# Altium footprint library Conectors.PcbLib: 122 footprints (part 7 of 8)
Each footprint in its own frame and in the unit in brackets; x right, y up, seen from the top. Pads: shape width x height; smd on the part's side, far side on the other; paste and mask are expansions set on the pad; w line width, h text height; cw(c..) or ccw(c..) is an arc to the next point about the centre after c.
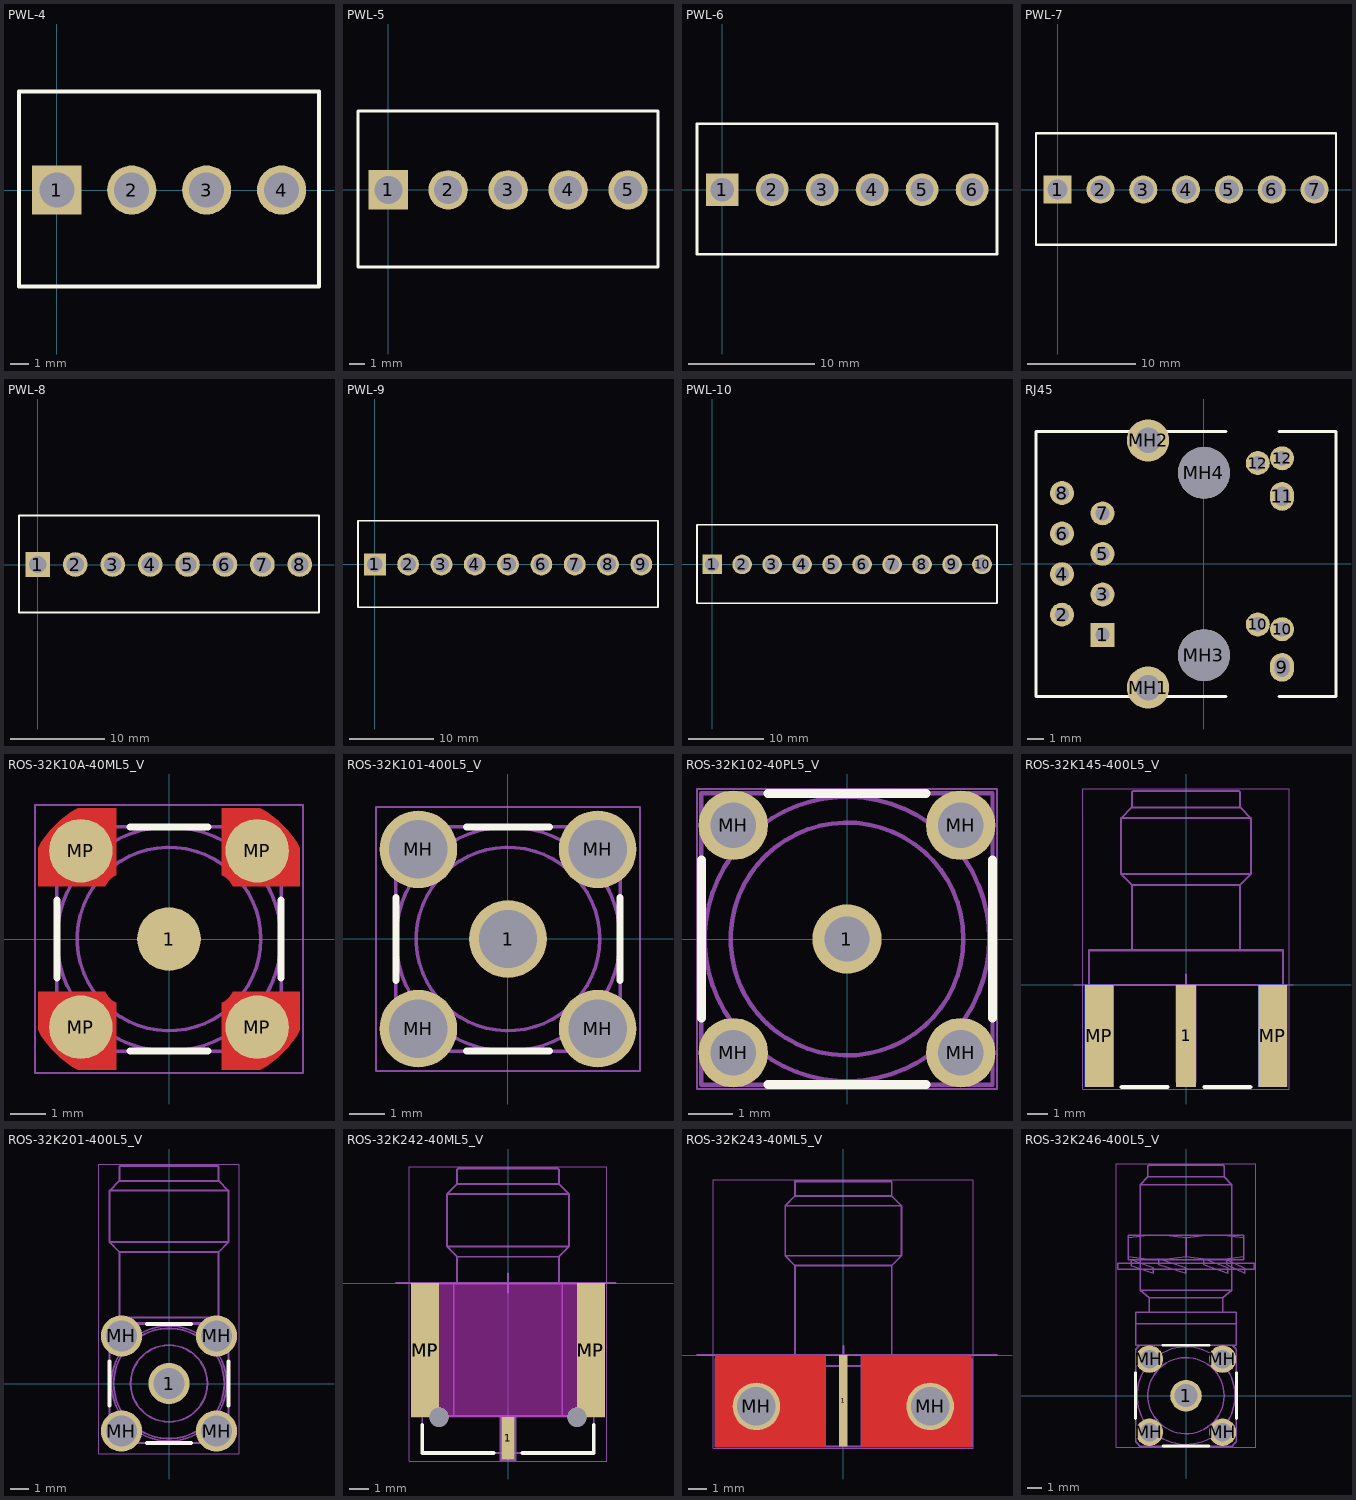
[diagram p6: the footprints below, top view; thin cyan lines are the x and y axes]

## PWL-4 [mm] "Connector; Header; 4 Position"
height 0.001
pads (4):
  rect 2.6x2.6 hole 1.85: 1(0,0)
  round 2.6 hole 1.85: 2(3.96,0) 3(7.92,0) 4(11.88,0)
Top Overlay:
  lines w0.2: -2,-5.1 -2,5.207 13.86,5.207 13.86,-5.1 -2,-5.1
3D body "PWL-4.stp": height 13.5, standoff -4, extent -1.98,-5 13.86,5

## PWL-5 [mm] "Connector; Header; 5 Position"
height 0.001
pads (5):
  rect 2.6x2.6 hole 1.85: 1(0,0)
  round 2.6 hole 1.85: 2(3.96,0) 3(7.92,0) 4(11.88,0) 5(15.84,0)
Top Overlay:
  lines w0.2: -2,-5.1 -2,5.207 17.82,5.207 17.82,-5.1 -2,-5.1
3D body "PWL-5.stp": height 13.5, standoff -4, extent -1.98,-5 17.82,5

## PWL-6 [mm] "Connector; Header; 6 Position"
height 0.001
pads (6):
  rect 2.6x2.6 hole 1.85: 1(0,0)
  round 2.6 hole 1.85: 2(3.96,0) 3(7.92,0) 4(11.88,0) 5(15.84,0) 6(19.8,0)
Top Overlay:
  lines w0.2: -2,-5.1 -2,5.207 21.78,5.207 21.78,-5.1 -2,-5.1
3D body "PWL-6.stp": height 13.5, standoff -4, extent -1.98,-5 21.78,5

## PWL-7 [mm] "Connector; Header; 7 Position"
height 0.001
pads (7):
  rect 2.6x2.6 hole 1.85: 1(0,0)
  round 2.6 hole 1.85: 2(3.96,0) 3(7.92,0) 4(11.88,0) 5(15.84,0) 6(19.8,0) 7(23.76,0)
Top Overlay:
  lines w0.2: -2,-5.1 25.74,-5.1 25.74,5.207 -2,5.207 -2,-5.1
3D body "PWL-7.stp": height 13.5, standoff -4, extent -1.98,-5 25.74,5

## PWL-8 [mm] "Connector; Header; 8 Position"
height 0.001
pads (8):
  rect 2.6x2.6 hole 1.85: 1(0,0)
  round 2.6 hole 1.85: 2(3.96,0) 3(7.92,0) 4(11.88,0) 5(15.84,0) 6(19.8,0) 7(23.76,0) 8(27.72,0)
Top Overlay:
  lines w0.2: -2,-5.1 -2,5.207 29.75,5.207 29.75,-5.1 -2,-5.1
3D body "PWL-8.stp": height 13.5, standoff -4, extent -1.962,-4.92 29.718,5.08

## PWL-9 [mm] "Connector; Header; 9 Position"
height 0.001
pads (9):
  rect 2.6x2.6 hole 1.85: 1(0,0)
  round 2.6 hole 1.85: 2(3.96,0) 3(7.92,0) 4(11.88,0) 5(15.84,0) 6(19.8,0) 7(23.76,0) 8(27.72,0) 9(31.68,0)
Top Overlay:
  lines w0.2: -2,-5.1 -2,5.207 33.66,5.207 33.66,-5.1 -2,-5.1
3D body "PWL-9.stp": height 13.5, standoff -4, extent -1.98,-5 33.66,5

## PWL-10 [mm] "Connector; Header; 10 Position"
height 0.001
pads (10):
  rect 2.6x2.6 hole 1.85: 1(0,0)
  round 2.6 hole 1.85: 2(3.96,0) 3(7.92,0) 4(11.88,0) 5(15.84,0) 6(19.8,0) 7(23.76,0) 8(27.72,0) 9(31.68,0) 10(35.64,0)
Top Overlay:
  lines w0.2: -2,-5.1 -2,5.207 37.62,5.207 37.62,-5.1 -2,-5.1
3D body "PWL-10.stp": height 13.5, standoff -4, extent -1.98,-5 37.62,5

## RJ45 [mm]
height 12
pads (18):
  rect 1.5x1.5 hole 0.9: 1(-6.35,-4.45)
  round 1.5 hole 0.9: 2(-8.89,-3.18) 3(-6.35,-1.91) 4(-8.89,-0.64) 5(-6.35,0.63) 6(-8.89,1.9) 7(-6.35,3.17) 8(-8.89,4.44) 10(3.38,-3.79) 10(4.9,-4.09) 12(3.38,6.32) 12(4.9,6.62)
  oval 1.5x1.8 hole 0.9 slot 1.2 at 90 deg: 9(4.9,-6.48) 11(4.9,4.23)
  round 2.65 hole 1.6: MH1(-3.5,-7.75) MH2(-3.5,7.74)
  round 3.25 hole 3.25 unplated: MH3(0,-5.72) MH4(0,5.71)
Top Overlay:
  lines w0.2: 1.378,-8.305 -10.52,-8.305 -10.52,8.295 1.378,8.295 ; 4.722,-8.305 8.28,-8.305 8.28,8.295 4.722,8.295
3D body "RJ-45-new.stp": height 12.71, standoff 0, extent -9.75,-7.51 7.75,7.51

## ROS-32K10A-40ML5_V [mm] "SMA Straight Jack, Press-Fit, 6.35x6.35x9.5mm, Rosenberger Recommended"
height 9.5
pads (5):
  round 1.8 smd: 1(0,0) MP(-2.5,-2.5) MP(-2.5,2.5) MP(2.5,-2.5) MP(2.5,2.5)
Top Layer:
  region: 1.5,1.8 1.549,1.777 1.64,1.716 1.716,1.639 1.777,1.549 1.8,1.5 3.7,1.5 3.7,2.587 3.608,2.765 3.371,3.088 3.088,3.371 2.765,3.608 2.587,3.7 1.5,3.7
  region: -1.8,1.5 -1.777,1.549 -1.716,1.64 -1.639,1.716 -1.549,1.777 -1.5,1.8 -1.5,3.7 -2.587,3.7 -2.765,3.608 -3.088,3.371 -3.371,3.088 -3.608,2.765 -3.7,2.587 -3.7,1.5
  region: -1.5,-1.8 -1.549,-1.777 -1.64,-1.716 -1.716,-1.639 -1.777,-1.549 -1.8,-1.5 -3.7,-1.5 -3.7,-2.587 -3.608,-2.765 -3.371,-3.088 -3.088,-3.371 -2.765,-3.608 -2.587,-3.7 -1.5,-3.7
  region: 1.8,-1.5 1.777,-1.549 1.716,-1.64 1.639,-1.716 1.549,-1.777 1.5,-1.8 1.5,-3.7 2.587,-3.7 2.765,-3.608 3.088,-3.371 3.371,-3.088 3.608,-2.765 3.7,-2.587 3.7,-1.5
Top Overlay:
  lines w0.2: -3.175,-1.1 -3.175,1.1 ; -1.1,-3.175 1.1,-3.175 ; -1.1,3.175 1.1,3.175 ; 3.175,-1.1 3.175,1.1
Mechanical 13:
  circle w0.1: c0,0 r0.635
  circle w0.1: c0,0 r2.6
  circle w0.1: c0,0 r3.175
  lines w0.1: -3.188,-2.811 ccw(c0,0) -2.811,-3.188 ; -3.188,2.811 cw(c0,0) -2.811,3.188 ; -3.175,-2.8 -3.175,2.8 ; -3.175,-1.9 -1.9,-1.9 -1.9,-3.175 ; -3.175,1.9 -1.9,1.9 -1.9,3.175 ; -2.8,-3.175 2.8,-3.175 ; -2.8,3.175 2.8,3.175 ; -0.1,-0.627 -0.1,0.627 ; 0.1,-0.627 0.1,0.627 ; 1.9,-3.175 1.9,-1.9 3.175,-1.9 ; 1.9,3.175 1.9,1.9 3.175,1.9 ; 2.811,-3.188 ccw(c0,0) 3.188,-2.811 ; 2.811,3.188 cw(c0,0) 3.188,2.811 ; 3.175,-2.8 3.175,2.8
Mechanical 15:
  lines w0.05: -3.8,-3.8 -3.8,3.8 3.8,3.8 3.8,-3.8 -3.8,-3.8
  lines w0.1: -0.5,0 0.5,0 ; 0,-0.5 0,0.5
3D body "32k10a-40ml5.stp": height 9.5, standoff 0, extent -3.175,-3.175 3.175,3.175

## ROS-32K101-400L5_V [mm] "SMA Straight Jack, 6.35x6.35x9.5mm, Rosenberger Recommended"
height 9.5
pads (5):
  round 2.2 hole 1.65: 1(0,0) MH(-2.54,-2.54) MH(-2.54,2.54) MH(2.54,-2.54) MH(2.54,2.54)
Top Overlay:
  lines w0.2: -3.175,-1.181 -3.175,1.181 ; -1.181,-3.175 1.181,-3.175 ; -1.181,3.175 1.181,3.175 ; 3.175,-1.181 3.175,1.181
Mechanical 13:
  circle w0.1: c0,0 r3.175
  circle w0.1: c0,0 r2.6
  circle w0.1: c0,0 r0.635
  lines w0.1: -3.19,-2.808 ccw(c0,0) -2.808,-3.191 ; -3.19,2.808 cw(c0,0) -2.808,3.19 ; -3.175,-2.794 -3.175,2.794 ; -3.04,-2.97 -3.04,-2.04 -2.04,-2.04 -2.04,-3.04 -2.97,-3.04 ; -3.04,2.97 -3.04,2.04 -2.04,2.04 -2.04,3.04 -2.97,3.04 ; -2.794,-3.175 2.794,-3.175 ; -2.794,3.175 2.794,3.175 ; -0.1,-0.627 -0.1,0.627 ; 0.1,-0.627 0.1,0.627 ; 2.808,-3.191 ccw(c0,0) 3.191,-2.808 ; 2.808,3.19 cw(c0,0) 3.191,2.808 ; 2.97,3.04 2.04,3.04 2.04,2.04 3.04,2.04 3.04,2.97 ; 2.97,-3.04 2.04,-3.04 2.04,-2.04 3.04,-2.04 3.04,-2.97 ; 3.175,-2.794 3.175,2.794
Mechanical 15:
  lines w0.05: -3.74,-3.74 -3.74,3.74 3.74,3.74 3.74,-3.74 -3.74,-3.74
  lines w0.1: -0.635,0 0.508,0 ; 0,-0.508 0,0.635
3D body "32k101-400l5.stp": height 9.5, standoff -4, extent -3.175,-3.175 3.175,3.175

## ROS-32K102-40PL5_V [mm] "SMA Straight Jack, 6.5x6.5x9.5mm, Rosenberger Recommended"
height 9.5
pads (5):
  round 1.55 hole 1.015: 1(0,0) MH(-2.54,-2.54) MH(-2.54,2.54) MH(2.54,-2.54) MH(2.54,2.54)
Top Overlay:
  lines w0.2: -3.25,-1.767 -3.25,1.767 ; -1.767,-3.25 1.767,-3.25 ; -1.767,3.25 1.767,3.25 ; 3.25,-1.767 3.25,1.767
Mechanical 13:
  circle w0.1: c0,0 r3.175
  circle w0.1: c0,0 r2.6
  circle w0.1: c0,0 r0.635
  lines w0.1: -0.1,-0.627 -0.1,0.627 ; 0.1,-0.627 0.1,0.627 ; -2.84,-2.84 -2.24,-2.84 ; -2.84,-2.84 -2.84,-2.24 ; -2.84,-2.84 -2.665,-2.665 ; -2.84,-2.84 -2.729,-3.14 -2.351,-3.14 -2.24,-2.84 ; -2.84,-2.24 -2.665,-2.415 ; -2.84,-2.24 -2.24,-2.24 ; -2.84,-2.24 -2.729,-1.94 -2.351,-1.94 -2.24,-2.24 ; -2.84,2.24 -2.84,2.84 ; -2.84,2.24 -2.665,2.415 ; -2.84,2.24 -2.24,2.24 ; -2.84,2.24 -2.729,1.94 -2.351,1.94 -2.24,2.24 ; -2.84,2.84 -2.24,2.84 ; -2.84,2.84 -2.665,2.665 ; -2.84,2.84 -2.729,3.14 -2.351,3.14 -2.24,2.84 ; -2.665,-2.665 -2.665,-2.415 ; -2.665,-2.665 -2.415,-2.665 ; -2.665,-2.415 -2.415,-2.415 ; -2.665,2.415 -2.415,2.415 ; -2.665,2.415 -2.665,2.665 ; -2.665,2.665 -2.415,2.665 ; -2.415,-2.665 -2.415,-2.415 ; -2.415,-2.665 -2.24,-2.84 ; -2.415,-2.415 -2.24,-2.24 ; -2.415,2.415 -2.415,2.665 ; -2.415,2.415 -2.24,2.24 ; -2.415,2.665 -2.24,2.84 ; -2.24,-2.84 -2.24,-2.24 ; -2.24,2.24 -2.24,2.84 ; 2.24,-2.84 2.415,-2.665 ; 2.24,-2.84 2.84,-2.84 ; 2.24,-2.84 2.24,-2.24 ; 2.24,-2.84 2.351,-3.14 2.729,-3.14 2.84,-2.84 ; 2.24,-2.24 2.84,-2.24 ; 2.24,-2.24 2.415,-2.415 ; 2.24,-2.24 2.351,-1.94 2.729,-1.94 2.84,-2.24 ; 2.24,2.24 2.351,1.94 2.729,1.94 2.84,2.24 ; 2.24,2.24 2.415,2.415 ; 2.24,2.24 2.84,2.24 ; 2.24,2.24 2.24,2.84 ; 2.24,2.84 2.351,3.14 2.729,3.14 2.84,2.84 ; 2.24,2.84 2.84,2.84 ; 2.24,2.84 2.415,2.665 ; 2.415,-2.665 2.415,-2.415 ; 2.415,-2.665 2.665,-2.665 ; 2.415,-2.415 2.665,-2.415 ; 2.415,2.415 2.665,2.415 ; 2.415,2.415 2.415,2.665 ; 2.415,2.665 2.665,2.665 ; 2.665,-2.665 2.665,-2.415 ; 2.665,-2.665 2.84,-2.84 ; 2.665,-2.415 2.84,-2.24 ; 2.665,2.415 2.84,2.24 ; 2.665,2.415 2.665,2.665 ; 2.665,2.665 2.84,2.84 ; 2.84,-2.84 2.84,-2.24 ; 2.84,2.24 2.84,2.84 ; -3.25,-3.25 -3.25,3.25 3.25,3.25 3.25,-3.25 -3.25,-3.25
Mechanical 15:
  lines w0.05: -3.35,-3.35 3.35,-3.35 3.35,3.35 -3.35,3.35 -3.35,-3.35
  lines w0.1: -0.5,0 0.5,0 ; 0,-0.5 0,0.5
3D body "32k102-40pl5.stp": height 9.5, standoff -2.8, extent -3.25,-3.25 3.25,3.25

## ROS-32K145-400L5_V [mm] "SMA Right Angle Jack, Edge Mount, 14.25x9.5x4.46mm, Rosenberger Recommended"
height 4.46
pads (5):
  rect 1x5 smd: 1(0,-2.5)
  rect 1.4x5 smd: MP(-4.25,-2.5) MP(4.25,-2.5)
  rect 1.4x5 smd far side paste-2: ""(-4.25,-2.5) ""(4.25,-2.5)
Top Overlay:
  lines w0.2: -3.15,-5 -0.9,-5 ; 0.9,-5 3.15,-5
Mechanical 3:
  lines w0.05: -5.5,0 5.25,0
  text "Board Edge" at -8.1,0 h0.2
Mechanical 13:
  lines w0.1: -3.75,0 -3.75,-4.75 -4.75,-4.75 -4.75,0 ; -2.65,1.7 -2.65,4.9 ; -0.46,0 -0.46,-4.75 0.46,-4.75 0.46,0 ; 2.65,1.7 2.65,4.9 ; 3.75,0 3.75,-4.75 4.75,-4.75 4.75,0 ; -4.75,0 4.75,0 ; -4.75,0 -4.75,1.7 4.75,1.7 4.75,0 ; -3.175,5.425 -3.175,8.175 ; -3.175,5.425 -2.65,4.9 ; -3.175,5.425 3.175,5.425 ; -3.175,8.175 3.175,8.175 ; -3.175,8.175 -2.65,8.7 ; -2.65,4.9 2.65,4.9 ; -2.65,8.7 -2.65,9.45 -2.6,9.5 2.6,9.5 2.65,9.45 2.65,8.7 ; -2.65,8.7 2.65,8.7 ; 2.65,4.9 3.175,5.425 ; 2.65,8.7 3.175,8.175 ; 3.175,5.425 3.175,8.175
Mechanical 15:
  lines w0.05: -5.05,-5.1 5.05,-5.1 5.05,9.6 -5.05,9.6 -5.05,-5.1
  lines w0.1: -0.5,0 0.5,0 ; 0,-0.5 0,0.5
3D body "32k145-400l5.stp": height 4.46, standoff -3.7, extent -4.75,-4.75 4.75,9.5

## ROS-32K201-400L5_V [mm] "SMA Right Angle Jack, 14.8x6.35x9.6mm, Rosenberger Recommended"
height 9.6
pads (5):
  round 2.2 hole 1.65: 1(0,0) MH(-2.54,-2.54) MH(-2.54,2.54) MH(2.54,-2.54) MH(2.54,2.54)
Top Overlay:
  lines w0.2: -3.175,-1.181 -3.175,1.181 ; -1.181,-3.175 1.181,-3.175 ; -1.181,3.175 1.181,3.175 ; 3.175,-1.181 3.175,1.181
Mechanical 13:
  circle w0.1: c0,0 r3.075
  circle w0.1: c0,0 r0.635
  circle w0.1: c0,0 r2.95
  circle w0.1: c0,0 r2.05
  lines w0.05: -2.9,3.275 2.9,3.275
  lines w0.1: -3.175,2.9 cw(c0,0) -2.9,3.175 -2.9,3.275 -2.65,3.525 ; -3.175,2.905 -3.175,-2.9 ccw(c0,0) -2.9,-3.175 2.9,-3.175 ccw(c0,0) 3.175,-2.9 3.175,2.9 ccw(c0,0) 2.9,3.175 ; -2.905,3.175 2.9,3.175 ; -3.175,7.55 -3.175,10.3 ; -3.175,7.55 -2.65,7.025 ; -3.175,7.55 3.175,7.55 ; -3.175,10.3 -2.65,10.825 ; -3.175,10.3 3.175,10.3 ; -2.65,3.525 -2.65,7.025 ; -2.65,3.525 2.65,3.525 ; -2.65,7.025 2.65,7.025 ; -2.65,10.825 -2.65,11.575 -2.6,11.625 -2.375,11.625 2.375,11.625 2.6,11.625 2.65,11.575 2.65,10.825 ; -2.65,10.825 2.65,10.825 ; 2.65,3.525 2.9,3.275 2.9,3.175 ; 2.65,3.525 2.65,7.025 ; 2.65,7.025 3.175,7.55 ; 2.65,10.825 3.175,10.3 ; 3.175,7.55 3.175,10.3 ; -3.04,-3.04 -3.04,-2.04 -2.04,-2.04 -2.04,-3.04 -3.04,-3.04 ; -3.04,2.04 -2.04,2.04 -2.04,3.04 -3.04,3.04 -3.04,2.04 ; 2.04,-3.04 2.04,-2.04 3.04,-2.04 3.04,-3.04 2.04,-3.04 ; 2.04,2.04 3.04,2.04 3.04,3.04 2.04,3.04 2.04,2.04
Mechanical 15:
  lines w0.05: -3.74,-3.74 3.74,-3.74 3.74,11.725 -3.74,11.725 -3.74,-3.74
  lines w0.1: -0.5,0 0.5,0 ; 0,-0.5 0,0.5
3D body "32k201-400l5.stp": height 9.6, standoff -3.9, extent -3.175,-3.175 3.175,11.625

## ROS-32K242-40ML5_V [mm] "SMA Right Angle Jack, Edge Mount, 14.84x8.944x4.00mm, Rosenberger Recommended"
height 4
pads (5):
  rect 0.7x2.2 smd: 1(0,-8.1)
  rect 1.45x7 smd: MP(-4.325,-3.5) MP(4.325,-3.5)
  rect 1.45x7 smd far side paste-2: MP(-4.325,-3.5) MP(4.325,-3.5)
via 3.6,-7 diameter 1 hole 1
via -3.6,-7 diameter 1 hole 1
Top Overlay:
  lines w0.2: -4.472,-7.4 -4.472,-8.869 -0.75,-8.869 ; 0.75,-8.869 4.472,-8.869 4.472,-7.4
Keep-Out Layer:
  board cut-out: -3.6,-7 3.6,-7 3.6,0 -3.6,0
Mechanical 3:
  lines w0.1: -5.85,0 5.6,0
  text "Board Edge" at -8.244,0.027 h0.2
  text "Plated Edge" at -3.5,-4.75 h0.2
  text "Unplated Edge" at -1.143,-7 h0.2
  text "Plated Edge" at 3.65,-4.65 h0.2
Mechanical 13:
  lines w0.1: -2.828,-6.929 -2.828,-0.029 ; -2.65,-0.029 -2.65,1.371 ; -0.395,-6.929 -0.395,-9.25 0.395,-9.25 0.395,-6.929 ; 2.65,-0.029 2.65,1.371 ; 2.829,-6.929 2.829,-0.029 ; -4.472,-6.929 -4.472,-8.869 4.472,-8.869 4.472,-6.929 ; -4.472,-6.929 -4.472,-0.029 4.472,-0.029 4.472,-6.929 ; -4.472,-6.929 4.472,-6.929 ; -3.175,1.896 -2.65,1.371 ; -3.175,1.896 -3.175,4.646 ; -3.175,1.896 3.175,1.896 ; -3.175,4.646 -2.65,5.171 ; -3.175,4.646 3.175,4.646 ; -2.65,1.371 2.65,1.371 ; -2.65,5.171 -2.65,5.921 -2.6,5.971 2.6,5.971 2.65,5.921 2.65,5.171 ; -2.65,5.171 2.65,5.171 ; 2.65,1.371 3.175,1.896 ; 2.65,5.171 3.175,4.646 ; 3.175,1.896 3.175,4.646
Mechanical 15:
  lines w0.05: -5.15,-9.3 -5.15,6.071 5.15,6.071 5.15,-9.3 -5.15,-9.3
  lines w0.1: -0.5,0 0.5,0 ; 0,-0.5 0,0.5
3D body "32k242-40ml5.stp": height 4, standoff -3, extent -4.472,-8.869 4.472,5.971

## ROS-32K243-40ML5_V [mm] "SMA Jack, Right Angle, Edge Mount Screw On, 14.50x14.00x5.15mm, Rosenberger Recommended"
height 5.15
pads (3):
  rect 0.48x5 smd: 1(0,-2.5)
  round 2.6 hole 2.1: MH(-4.75,-2.8) MH(4.75,-2.8)
Top Layer:
  region: 1,0 4.75,0 4.75,-1.75 4.888,-1.75 5.155,-1.822 5.395,-1.96 5.59,-2.155 5.728,-2.395 5.8,-2.662 5.8,-2.938 5.728,-3.205 5.59,-3.445 5.395,-3.64 5.155,-3.778 4.888,-3.85 4.75,-3.85 4.612,-3.85 4.345,-3.778 4.105,-3.64 3.91,-3.445 3.772,-3.205 3.7,-2.938 3.7,-2.662 3.772,-2.395 3.91,-2.155 4.105,-1.96 4.345,-1.822 4.612,-1.75 4.75,-1.75 4.75,0 7,0 7,-5 1,-5
  region: -1,0 -4.75,0 -4.75,-1.75 -4.888,-1.75 -5.155,-1.822 -5.395,-1.96 -5.59,-2.155 -5.728,-2.395 -5.8,-2.662 -5.8,-2.938 -5.728,-3.205 -5.59,-3.445 -5.395,-3.64 -5.155,-3.778 -4.888,-3.85 -4.75,-3.85 -4.612,-3.85 -4.345,-3.778 -4.105,-3.64 -3.91,-3.445 -3.772,-3.205 -3.7,-2.938 -3.7,-2.662 -3.772,-2.395 -3.91,-2.155 -4.105,-1.96 -4.345,-1.822 -4.612,-1.75 -4.75,-1.75 -4.75,0 -7,0 -7,-5 -1,-5
Bottom Layer:
  region: -1,0 -4.75,0 -4.75,-1.75 -4.888,-1.75 -5.155,-1.822 -5.395,-1.96 -5.59,-2.155 -5.728,-2.395 -5.8,-2.662 -5.8,-2.938 -5.728,-3.205 -5.59,-3.445 -5.395,-3.64 -5.155,-3.778 -4.888,-3.85 -4.75,-3.85 -4.612,-3.85 -4.345,-3.778 -4.105,-3.64 -3.91,-3.445 -3.772,-3.205 -3.7,-2.938 -3.7,-2.662 -3.772,-2.395 -3.91,-2.155 -4.105,-1.96 -4.345,-1.822 -4.612,-1.75 -4.75,-1.75 -4.75,0 -7,0 -7,-5 -1,-5
  region: 1,0 4.75,0 4.75,-1.75 4.888,-1.75 5.155,-1.822 5.395,-1.96 5.59,-2.155 5.728,-2.395 5.8,-2.662 5.8,-2.938 5.728,-3.205 5.59,-3.445 5.395,-3.64 5.155,-3.778 4.888,-3.85 4.75,-3.85 4.612,-3.85 4.345,-3.778 4.105,-3.64 3.91,-3.445 3.772,-3.205 3.7,-2.938 3.7,-2.662 3.772,-2.395 3.91,-2.155 4.105,-1.96 4.345,-1.822 4.612,-1.75 4.75,-1.75 4.75,0 7,0 7,-5 1,-5
Mechanical 3:
  lines w0.1: -8,0 8.4,0
  text "Board Edge" at -10.5,0.1 h0.2
Mechanical 13:
  circle w0.1: c-4.75,-2.8 r1.89
  circle w0.1: c4.75,-2.8 r1.89
  lines w0.1: -7,-0.6 7,-0.6 ; -6.458,-5 -6.458,-0.2 ; -2.65,-0.2 -2.65,4.9 ; -1,-5 -1,-0.2 ; -1,-0.6 1,-0.6 ; -0.125,0 -0.125,-0.79 0.125,-0.79 0.125,0 ; 1,-5 1,-0.2 ; 2.65,-0.2 2.65,4.9 ; 6.458,-5 6.458,-0.2 ; -6.458,-0.2 -1,-0.2 ; -6.458,-0.2 -7,-0.2 -7,-5 7,-5 7,-0.2 6.458,-0.2 ; -3.18,5.43 -2.65,4.9 ; -3.18,5.43 -3.18,8.17 ; -3.18,5.43 3.18,5.43 ; -3.18,8.17 -2.65,8.7 ; -3.18,8.17 3.18,8.17 ; -2.65,4.9 2.65,4.9 ; -2.65,8.7 -2.65,9.5 2.65,9.5 2.65,8.7 ; -2.65,8.7 2.65,8.7 ; -1,-0.2 -1,0 1,0 1,-0.2 ; 1,-0.2 6.458,-0.2 ; 2.65,4.9 3.18,5.43 ; 2.65,8.7 3.18,8.17 ; 3.18,5.43 3.18,8.17 ; -5.616,-2.8 -5.183,-3.55 -4.317,-3.55 -3.884,-2.8 -4.317,-2.05 -5.183,-2.05 -5.616,-2.8 ; 3.884,-2.8 4.317,-2.05 5.183,-2.05 5.616,-2.8 5.183,-3.55 4.317,-3.55 3.884,-2.8
Mechanical 15:
  lines w0.05: -7.1,-5.1 7.1,-5.1 7.1,9.6 -7.1,9.6 -7.1,-5.1
  lines w0.1: -0.5,0 0.5,0 ; 0,-0.5 0,0.5
3D body "32k243-40ml5.stp": height 5.15, standoff -4.85, extent -7,-5 7,9.5

## ROS-32K246-400L5_V [mm] "SMA Right Angle Jack, Panel Mount, 19.50x9.50x10.00mm, Rosenberger Recommended"
height 10
pads (5):
  round 2.2 hole 1.6: 1(0,0)
  round 1.9 hole 1.3: MH(-2.54,-2.54) MH(-2.54,2.54) MH(2.54,-2.54) MH(2.54,2.54)
Top Overlay:
  lines w0.2: -3.5,-1.591 -3.5,1.591 ; -1.591,-3.5 1.591,-3.5 ; -1.591,3.5 1.591,3.5 ; 3.5,-1.591 3.5,1.591
Mechanical 13:
  circle w0.1: c0,0 r2.65
  circle w0.1: c0,0 r3.4
  circle w0.1: c0,0 r0.635
  lines w0.1: -4,9.652 -3.439,9.575 -2.887,9.521 -2,9.486 -1.113,9.521 -0.561,9.575 0,9.652 ; -4,10.984 -3.439,11.061 -2.887,11.115 -2,11.15 -1.113,11.115 -0.561,11.061 0,10.984 ; -3.501,-3.21 ccw(c0,0) -3.21,-3.501 ; -3.501,3.21 cw(c0,0) -3.21,3.501 ; -3.5,-3.211 -3.5,3.211 ; -3.211,-3.5 3.211,-3.5 ; -2.56,5.8 -2.56,6.8 ; 1.231,9.5 2.899,8.9 2.899,8.5 1.231,9.11 1.231,9.51 ; 2.56,5.8 2.56,6.8 ; 3.21,-3.501 ccw(c0,0) 3.501,-3.21 ; 3.21,3.501 cw(c0,0) 3.501,3.21 ; 3.5,-3.211 3.5,3.209 ; 4,9.652 3.439,9.575 2.887,9.521 2,9.486 1.113,9.521 0.561,9.575 0,9.652 ; 4,10.984 3.439,11.061 2.887,11.115 2,11.15 1.113,11.115 0.561,11.061 0,10.984 ; -3.5,5 -3.5,5.8 3.5,5.8 3.5,5 ; -3.5,5 3.5,5 ; -3.5,5 -3.5,3.5 -3.211,3.5 ; -3.211,3.5 3.209,3.5 3.5,3.5 3.5,5 ; -3.175,7.325 3.175,7.325 ; -3.175,7.325 -2.56,6.8 ; -3.175,7.325 -3.175,14.675 ; -3.175,14.675 3.175,14.675 ; -3.175,14.675 -2.65,15.2 ; -2.65,15.2 2.65,15.2 ; -2.65,15.2 -2.65,15.95 -2.6,16 2.6,16 2.65,15.95 2.65,15.2 ; -2.56,6.8 2.56,6.8 ; 0,9.652 0,10.984 ; 2.56,6.8 3.175,7.325 ; 2.65,15.2 3.175,14.675 ; 3.175,7.325 3.175,14.675 ; -4.75,8.8 4.75,8.8 4.75,9.2 -4.75,9.2 -4.75,8.8 ; -4,9.45 -4,11.15 4,11.15 4,9.45 -4,9.45 ; -3.82,9.016 -2.263,8.5 -2.263,8.9 -3.81,9.45 -3.82,9.016 ; -2.94,-2.94 -2.14,-2.94 -2.14,-2.14 -2.94,-2.14 -2.94,-2.94 ; -2.94,2.14 -2.94,2.94 -2.14,2.94 -2.14,2.14 -2.94,2.14 ; -1.895,9.1 0,8.5 0,8.9 -1.895,9.5 -1.895,9.1 ; 2.14,-2.94 2.94,-2.94 2.94,-2.14 2.14,-2.14 2.14,-2.94 ; 2.14,2.14 2.14,2.94 2.94,2.94 2.94,2.14 2.14,2.14 ; 2.838,9.1 4.1,8.5 4.1,8.85 2.838,9.45 2.838,9.1
Mechanical 15:
  lines w0.05: -4.85,-3.6 -4.85,16.1 4.85,16.1 4.85,-3.6 -4.85,-3.6
  lines w0.1: -0.5,0 0.5,0 ; 0,-0.5 0,0.5
3D body "32k246-400l5.stp": height 10, standoff -4, extent -4.75,-3.5 4.75,16